# Altium footprint library SG__PCB_HOLE_Connector.PcbLib: 174 footprints (part 11 of 11)
Each footprint in its own frame and in the unit in brackets; x right, y up, seen from the top. Pads: shape width x height; smd on the part's side, far side on the other; paste and mask are expansions set on the pad; w line width, h text height; cw(c..) or ccw(c..) is an arc to the next point about the centre after c.
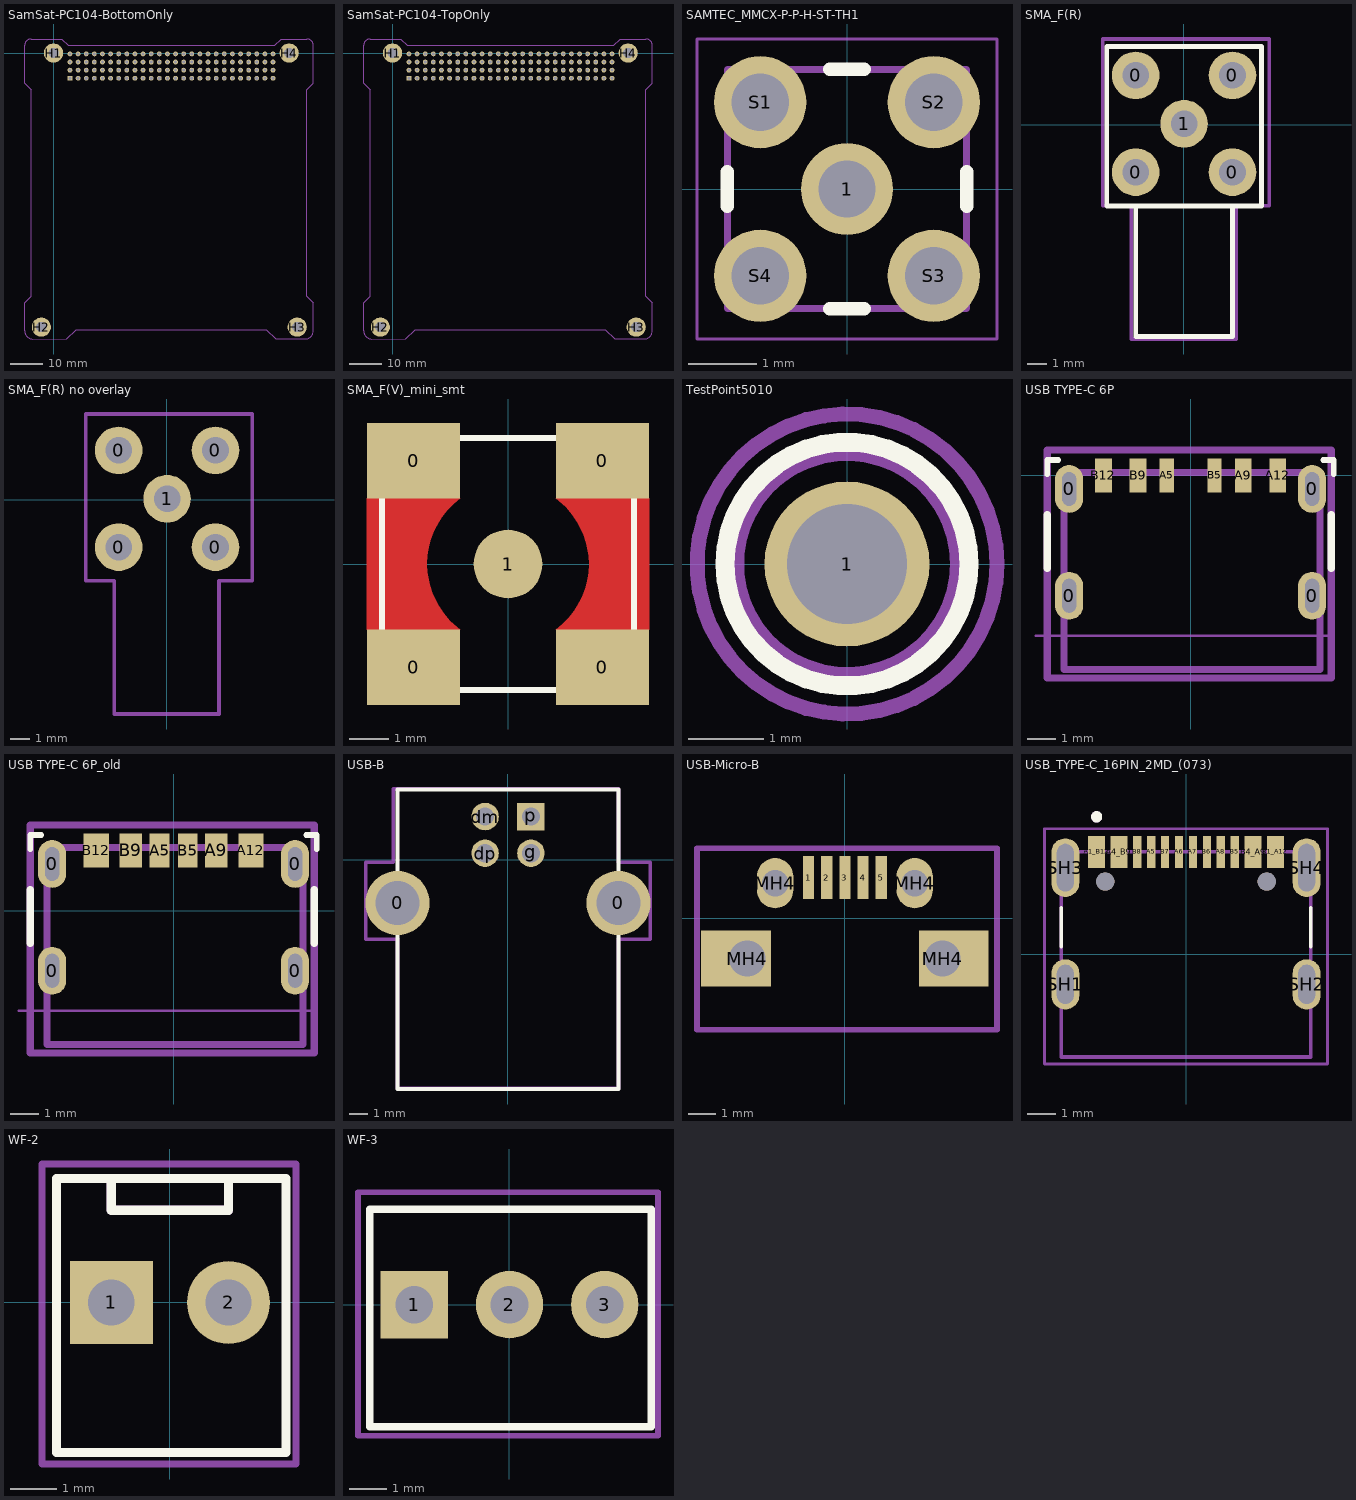
[diagram p10: the footprints below, top view; thin cyan lines are the x and y axes]

## SamSat-PC104-BottomOnly [mm]
pads (108):
  rect 1.5x1.5 hole 1: 1(5.15,-7.88)
  round 1.5 hole 1: 2(5.15,-5.34) 3(7.69,-7.88) 4(7.69,-5.34) 5(10.23,-7.88) 6(10.23,-5.34) 7(12.77,-7.88) 8(12.77,-5.34) 9(15.31,-7.88) 10(15.31,-5.34) 11(17.85,-7.88) 12(17.85,-5.34) 13(20.39,-7.88) 14(20.39,-5.34) 15(22.93,-7.88) 16(22.93,-5.34) 17(25.47,-7.88) 18(25.47,-5.34) 19(28.01,-7.88) 20(28.01,-5.34) 21(30.55,-7.88) 22(30.55,-5.34) 23(33.09,-7.88) 24(33.09,-5.34) 25(35.63,-7.88) 26(35.63,-5.34) 27(38.17,-7.88) 28(38.17,-5.34) 29(40.71,-7.88) 30(40.71,-5.34) 31(43.25,-7.88) 32(43.25,-5.34) 33(45.79,-7.88) 34(45.79,-5.34) 35(48.33,-7.88) 36(48.33,-5.34) 37(50.87,-7.88) 38(50.87,-5.34) 39(53.41,-7.88) 40(53.41,-5.34) 41(55.95,-7.88) 42(55.95,-5.34) 43(58.49,-7.88) 44(58.49,-5.34) 45(61.03,-7.88) 46(61.03,-5.34) 47(63.57,-7.88) 48(63.57,-5.34) 49(66.11,-7.88) 50(66.11,-5.34) 51(68.65,-7.88) 52(68.65,-5.34) 53(5.15,-2.8) 54(5.15,-0.26) 55(7.69,-2.8) 56(7.69,-0.26) 57(10.23,-2.8) 58(10.23,-0.26) 59(12.77,-2.8) 60(12.77,-0.26) 61(15.31,-2.8) 62(15.31,-0.26) 63(17.85,-2.8) 64(17.85,-0.26) 65(20.39,-2.8) 66(20.39,-0.26) 67(22.93,-2.8) 68(22.93,-0.26) 69(25.47,-2.8) 70(25.47,-0.26) 71(28.01,-2.8) 72(28.01,-0.26) 73(30.55,-2.8) 74(30.55,-0.26) 75(33.09,-2.8) 76(33.09,-0.26) 77(35.63,-2.8) 78(35.63,-0.26) 79(38.17,-2.8) 80(38.17,-0.26) 81(40.71,-2.8) 82(40.71,-0.26) 83(43.25,-2.8) 84(43.25,-0.26) 85(45.79,-2.8) 86(45.79,-0.26) 87(48.33,-2.8) 88(48.33,-0.26) 89(50.87,-2.8) 90(50.87,-0.26) 91(53.41,-2.8) 92(53.41,-0.26) 93(55.95,-2.8) 94(55.95,-0.26) 95(58.49,-2.8) 96(58.49,-0.26) 97(61.03,-2.8) 98(61.03,-0.26) 99(63.57,-2.8) 100(63.57,-0.26) 101(66.11,-2.8) 102(66.11,-0.26) 103(68.65,-2.8) 104(68.65,-0.26)
  round 6 hole 3.2: H1(0,0) H2(-3.8,-85.7) H3(76.2,-85.7) H4(73.7,0)
Board Shape:
  lines w0.254: -7.013,-76.129 -7.013,-11.529 -9.03,-9.512 -9.03,2.4 cw(c-7.03,2.4) -7.03,4.4 2.533,4.4 4.55,2.383 69.15,2.383 71.167,4.4 79.27,4.4 cw(c79.27,2.4) 81.27,2.4 81.27,-9.512 79.253,-11.529 79.253,-76.129 ; -7.013,-76.123 -9.03,-78.14 -9.03,-86.892 ccw(c-6.5,-86.892) -6.5,-89.422 4.175,-89.417 7.125,-86.467 66.55,-86.467 69.5,-89.417 78.729,-89.417 ccw(c78.718,-86.865) 81.27,-86.855 81.27,-78.14 79.253,-76.123
3D body "header2.stp": height 8.45, standoff 0, extent 21.705,-9.06 24.155,-4.16
3D body "header2.stp": height 8.45, standoff 0, extent 19.165,-9.06 21.615,-4.16
3D body "header2.stp": height 8.45, standoff 0, extent 16.625,-9.06 19.075,-4.16
3D body "header2.stp": height 8.45, standoff 0, extent 14.085,-9.06 16.535,-4.16
3D body "header2.stp": height 8.45, standoff 0, extent 3.925,-9.06 6.375,-4.16
3D body "header2.stp": height 8.45, standoff 0, extent 6.465,-9.06 8.915,-4.16
3D body "header2.stp": height 8.45, standoff 0, extent 9.005,-9.06 11.455,-4.16
3D body "header2.stp": height 8.45, standoff 0, extent 11.545,-9.06 13.995,-4.16
3D body "header2.stp": height 8.45, standoff 0, extent 24.245,-9.06 26.695,-4.16
3D body "header2.stp": height 8.45, standoff 0, extent 26.785,-9.06 29.235,-4.16
3D body "header2.stp": height 8.45, standoff 0, extent 29.325,-9.06 31.775,-4.16
3D body "header2.stp": height 8.45, standoff 0, extent 31.865,-9.06 34.315,-4.16
3D body "header2.stp": height 8.45, standoff 0, extent 52.185,-9.06 54.635,-4.16
3D body "header2.stp": height 8.45, standoff 0, extent 49.645,-9.06 52.095,-4.16
3D body "header2.stp": height 8.45, standoff 0, extent 47.105,-9.06 49.555,-4.16
3D body "header2.stp": height 8.45, standoff 0, extent 44.565,-9.06 47.015,-4.16
3D body "header2.stp": height 8.45, standoff 0, extent 34.405,-9.06 36.855,-4.16
3D body "header2.stp": height 8.45, standoff 0, extent 36.945,-9.06 39.395,-4.16
3D body "header2.stp": height 8.45, standoff 0, extent 39.485,-9.06 41.935,-4.16
3D body "header2.stp": height 8.45, standoff 0, extent 42.025,-9.06 44.475,-4.16
3D body "header2.stp": height 8.45, standoff 0, extent 54.725,-9.06 57.175,-4.16
3D body "header2.stp": height 8.45, standoff 0, extent 57.265,-9.06 59.715,-4.16
3D body "header2.stp": height 8.45, standoff 0, extent 59.805,-9.06 62.255,-4.16
3D body "header2.stp": height 8.45, standoff 0, extent 62.345,-9.06 64.795,-4.16
3D body "header2.stp": height 8.45, standoff 0, extent 64.885,-9.06 67.335,-4.16
3D body "header2.stp": height 8.45, standoff 0, extent 67.425,-9.06 69.875,-4.16
3D body "header2.stp": height 8.45, standoff 0, extent 21.705,-3.98 24.155,0.92
3D body "header2.stp": height 8.45, standoff 0, extent 19.165,-3.98 21.615,0.92
3D body "header2.stp": height 8.45, standoff 0, extent 16.625,-3.98 19.075,0.92
3D body "header2.stp": height 8.45, standoff 0, extent 14.085,-3.98 16.535,0.92
3D body "header2.stp": height 8.45, standoff 0, extent 3.925,-3.98 6.375,0.92
3D body "header2.stp": height 8.45, standoff 0, extent 6.465,-3.98 8.915,0.92
3D body "header2.stp": height 8.45, standoff 0, extent 9.005,-3.98 11.455,0.92
3D body "header2.stp": height 8.45, standoff 0, extent 11.545,-3.98 13.995,0.92
3D body "header2.stp": height 8.45, standoff 0, extent 24.245,-3.98 26.695,0.92
3D body "header2.stp": height 8.45, standoff 0, extent 26.785,-3.98 29.235,0.92
3D body "header2.stp": height 8.45, standoff 0, extent 29.325,-3.98 31.775,0.92
3D body "header2.stp": height 8.45, standoff 0, extent 31.865,-3.98 34.315,0.92
3D body "header2.stp": height 8.45, standoff 0, extent 52.185,-3.98 54.635,0.92
3D body "header2.stp": height 8.45, standoff 0, extent 49.645,-3.98 52.095,0.92
3D body "header2.stp": height 8.45, standoff 0, extent 47.105,-3.98 49.555,0.92
3D body "header2.stp": height 8.45, standoff 0, extent 44.565,-3.98 47.015,0.92
3D body "header2.stp": height 8.45, standoff 0, extent 34.405,-3.98 36.855,0.92
3D body "header2.stp": height 8.45, standoff 0, extent 36.945,-3.98 39.395,0.92
3D body "header2.stp": height 8.45, standoff 0, extent 39.485,-3.98 41.935,0.92
3D body "header2.stp": height 8.45, standoff 0, extent 42.025,-3.98 44.475,0.92
3D body "header2.stp": height 8.45, standoff 0, extent 54.725,-3.98 57.175,0.92
3D body "header2.stp": height 8.45, standoff 0, extent 57.265,-3.98 59.715,0.92
3D body "header2.stp": height 8.45, standoff 0, extent 59.805,-3.98 62.255,0.92
3D body "header2.stp": height 8.45, standoff 0, extent 62.345,-3.98 64.795,0.92
3D body "header2.stp": height 8.45, standoff 0, extent 64.885,-3.98 67.335,0.92
3D body "header2.stp": height 8.45, standoff 0, extent 67.425,-3.98 69.875,0.92

## SamSat-PC104-TopOnly [mm]
pads (108):
  rect 1.5x1.5 hole 1: 1(5.15,-7.88)
  round 1.5 hole 1: 2(5.15,-5.34) 3(7.69,-7.88) 4(7.69,-5.34) 5(10.23,-7.88) 6(10.23,-5.34) 7(12.77,-7.88) 8(12.77,-5.34) 9(15.31,-7.88) 10(15.31,-5.34) 11(17.85,-7.88) 12(17.85,-5.34) 13(20.39,-7.88) 14(20.39,-5.34) 15(22.93,-7.88) 16(22.93,-5.34) 17(25.47,-7.88) 18(25.47,-5.34) 19(28.01,-7.88) 20(28.01,-5.34) 21(30.55,-7.88) 22(30.55,-5.34) 23(33.09,-7.88) 24(33.09,-5.34) 25(35.63,-7.88) 26(35.63,-5.34) 27(38.17,-7.88) 28(38.17,-5.34) 29(40.71,-7.88) 30(40.71,-5.34) 31(43.25,-7.88) 32(43.25,-5.34) 33(45.79,-7.88) 34(45.79,-5.34) 35(48.33,-7.88) 36(48.33,-5.34) 37(50.87,-7.88) 38(50.87,-5.34) 39(53.41,-7.88) 40(53.41,-5.34) 41(55.95,-7.88) 42(55.95,-5.34) 43(58.49,-7.88) 44(58.49,-5.34) 45(61.03,-7.88) 46(61.03,-5.34) 47(63.57,-7.88) 48(63.57,-5.34) 49(66.11,-7.88) 50(66.11,-5.34) 51(68.65,-7.88) 52(68.65,-5.34) 53(5.15,-2.8) 54(5.15,-0.26) 55(7.69,-2.8) 56(7.69,-0.26) 57(10.23,-2.8) 58(10.23,-0.26) 59(12.77,-2.8) 60(12.77,-0.26) 61(15.31,-2.8) 62(15.31,-0.26) 63(17.85,-2.8) 64(17.85,-0.26) 65(20.39,-2.8) 66(20.39,-0.26) 67(22.93,-2.8) 68(22.93,-0.26) 69(25.47,-2.8) 70(25.47,-0.26) 71(28.01,-2.8) 72(28.01,-0.26) 73(30.55,-2.8) 74(30.55,-0.26) 75(33.09,-2.8) 76(33.09,-0.26) 77(35.63,-2.8) 78(35.63,-0.26) 79(38.17,-2.8) 80(38.17,-0.26) 81(40.71,-2.8) 82(40.71,-0.26) 83(43.25,-2.8) 84(43.25,-0.26) 85(45.79,-2.8) 86(45.79,-0.26) 87(48.33,-2.8) 88(48.33,-0.26) 89(50.87,-2.8) 90(50.87,-0.26) 91(53.41,-2.8) 92(53.41,-0.26) 93(55.95,-2.8) 94(55.95,-0.26) 95(58.49,-2.8) 96(58.49,-0.26) 97(61.03,-2.8) 98(61.03,-0.26) 99(63.57,-2.8) 100(63.57,-0.26) 101(66.11,-2.8) 102(66.11,-0.26) 103(68.65,-2.8) 104(68.65,-0.26)
  round 6 hole 3.2: H1(0,0) H2(-3.8,-85.7) H3(76.2,-85.7) H4(73.7,0)
Board Shape:
  lines w0.254: -7.013,-76.129 -7.013,-11.529 -9.03,-9.512 -9.03,2.4 cw(c-7.03,2.4) -7.03,4.4 2.533,4.4 4.55,2.383 69.15,2.383 71.167,4.4 79.27,4.4 cw(c79.27,2.4) 81.27,2.4 81.27,-9.512 79.253,-11.529 79.253,-76.129 ; -7.013,-76.123 -9.03,-78.14 -9.03,-86.892 ccw(c-6.5,-86.892) -6.5,-89.422 4.175,-89.417 7.125,-86.467 66.55,-86.467 69.5,-89.417 78.729,-89.417 ccw(c78.718,-86.865) 81.27,-86.855 81.27,-78.14 79.253,-76.123
3D body "PBS1-2.54.stp": height 9, standoff -2.65, extent 67.38,-1.53 69.92,1.01
3D body "PBS1-2.54.stp": height 9, standoff -2.65, extent 67.38,-4.07 69.92,-1.53
3D body "PBS1-2.54.stp": height 9, standoff -2.65, extent 54.68,-1.53 57.22,1.01
3D body "PBS1-2.54.stp": height 9, standoff -2.65, extent 54.68,-4.07 57.22,-1.53
3D body "PBS1-2.54.stp": height 9, standoff -2.65, extent 59.76,-1.53 62.3,1.01
3D body "PBS1-2.54.stp": height 9, standoff -2.65, extent 59.76,-4.07 62.3,-1.53
3D body "PBS1-2.54.stp": height 9, standoff -2.65, extent 57.22,-4.07 59.76,-1.53
3D body "PBS1-2.54.stp": height 9, standoff -2.65, extent 57.22,-1.53 59.76,1.01
3D body "PBS1-2.54.stp": height 9, standoff -2.65, extent 64.84,-1.53 67.38,1.01
3D body "PBS1-2.54.stp": height 9, standoff -2.65, extent 64.84,-4.07 67.38,-1.53
3D body "PBS1-2.54.stp": height 9, standoff -2.65, extent 62.3,-4.07 64.84,-1.53
3D body "PBS1-2.54.stp": height 9, standoff -2.65, extent 62.3,-1.53 64.84,1.01
3D body "PBS1-2.54.stp": height 9, standoff -2.65, extent 14.04,-4.07 16.58,-1.53
3D body "PBS1-2.54.stp": height 9, standoff -2.65, extent 16.58,-4.07 19.12,-1.53
3D body "PBS1-2.54.stp": height 9, standoff -2.65, extent 16.58,-1.53 19.12,1.01
3D body "PBS1-2.54.stp": height 9, standoff -2.65, extent 8.96,-1.53 11.5,1.01
3D body "PBS1-2.54.stp": height 9, standoff -2.65, extent 8.96,-4.07 11.5,-1.53
3D body "PBS1-2.54.stp": height 9, standoff -2.65, extent 11.5,-4.07 14.04,-1.53
3D body "PBS1-2.54.stp": height 9, standoff -2.65, extent 11.5,-1.53 14.04,1.01
3D body "PBS1-2.54.stp": height 9, standoff -2.65, extent 6.42,-1.53 8.96,1.01
3D body "PBS1-2.54.stp": height 9, standoff -2.65, extent 6.42,-4.07 8.96,-1.53
3D body "PBS1-2.54.stp": height 9, standoff -2.65, extent 3.88,-4.07 6.42,-1.53
3D body "PBS1-2.54.stp": height 9, standoff -2.65, extent 3.88,-1.53 6.42,1.01
3D body "PBS1-2.54.stp": height 9, standoff -2.65, extent 29.28,-1.53 31.82,1.01
3D body "PBS1-2.54.stp": height 9, standoff -2.65, extent 29.28,-4.07 31.82,-1.53
3D body "PBS1-2.54.stp": height 9, standoff -2.65, extent 31.82,-4.07 34.36,-1.53
3D body "PBS1-2.54.stp": height 9, standoff -2.65, extent 31.82,-1.53 34.36,1.01
3D body "PBS1-2.54.stp": height 9, standoff -2.65, extent 36.9,-1.53 39.44,1.01
3D body "PBS1-2.54.stp": height 9, standoff -2.65, extent 36.9,-4.07 39.44,-1.53
3D body "PBS1-2.54.stp": height 9, standoff -2.65, extent 34.36,-4.07 36.9,-1.53
3D body "PBS1-2.54.stp": height 9, standoff -2.65, extent 34.36,-1.53 36.9,1.01
3D body "PBS1-2.54.stp": height 9, standoff -2.65, extent 41.98,-1.53 44.52,1.01
3D body "PBS1-2.54.stp": height 9, standoff -2.65, extent 41.98,-4.07 44.52,-1.53
3D body "PBS1-2.54.stp": height 9, standoff -2.65, extent 39.44,-4.07 41.98,-1.53
3D body "PBS1-2.54.stp": height 9, standoff -2.65, extent 39.44,-1.53 41.98,1.01
3D body "PBS1-2.54.stp": height 9, standoff -2.65, extent 47.06,-1.53 49.6,1.01
3D body "PBS1-2.54.stp": height 9, standoff -2.65, extent 47.06,-4.07 49.6,-1.53
3D body "PBS1-2.54.stp": height 9, standoff -2.65, extent 44.52,-4.07 47.06,-1.53
3D body "PBS1-2.54.stp": height 9, standoff -2.65, extent 44.52,-1.53 47.06,1.01
3D body "PBS1-2.54.stp": height 9, standoff -2.65, extent 52.14,-1.53 54.68,1.01
3D body "PBS1-2.54.stp": height 9, standoff -2.65, extent 52.14,-4.07 54.68,-1.53
3D body "PBS1-2.54.stp": height 9, standoff -2.65, extent 49.6,-4.07 52.14,-1.53
3D body "PBS1-2.54.stp": height 9, standoff -2.65, extent 49.6,-1.53 52.14,1.01
3D body "PBS1-2.54.stp": height 9, standoff -2.65, extent 24.2,-1.53 26.74,1.01
3D body "PBS1-2.54.stp": height 9, standoff -2.65, extent 24.2,-4.07 26.74,-1.53
3D body "PBS1-2.54.stp": height 9, standoff -2.65, extent 26.74,-4.07 29.28,-1.53
3D body "PBS1-2.54.stp": height 9, standoff -2.65, extent 26.74,-1.53 29.28,1.01
3D body "PBS1-2.54.stp": height 9, standoff -2.65, extent 19.12,-1.53 21.66,1.01
3D body "PBS1-2.54.stp": height 9, standoff -2.65, extent 19.12,-4.07 21.66,-1.53
3D body "PBS1-2.54.stp": height 9, standoff -2.65, extent 21.66,-4.07 24.2,-1.53
3D body "PBS1-2.54.stp": height 9, standoff -2.65, extent 21.66,-1.53 24.2,1.01
3D body "PBS1-2.54.stp": height 9, standoff -2.65, extent 14.04,-1.53 16.58,1.01
3D body "PBS1-2.54.stp": height 9, standoff -2.65, extent 67.38,-6.61 69.92,-4.07
3D body "PBS1-2.54.stp": height 9, standoff -2.65, extent 67.38,-9.15 69.92,-6.61
3D body "PBS1-2.54.stp": height 9, standoff -2.65, extent 54.68,-6.61 57.22,-4.07
3D body "PBS1-2.54.stp": height 9, standoff -2.65, extent 54.68,-9.15 57.22,-6.61
3D body "PBS1-2.54.stp": height 9, standoff -2.65, extent 59.76,-6.61 62.3,-4.07
3D body "PBS1-2.54.stp": height 9, standoff -2.65, extent 59.76,-9.15 62.3,-6.61
3D body "PBS1-2.54.stp": height 9, standoff -2.65, extent 57.22,-9.15 59.76,-6.61
3D body "PBS1-2.54.stp": height 9, standoff -2.65, extent 57.22,-6.61 59.76,-4.07
3D body "PBS1-2.54.stp": height 9, standoff -2.65, extent 64.84,-6.61 67.38,-4.07
3D body "PBS1-2.54.stp": height 9, standoff -2.65, extent 64.84,-9.15 67.38,-6.61
3D body "PBS1-2.54.stp": height 9, standoff -2.65, extent 62.3,-9.15 64.84,-6.61
3D body "PBS1-2.54.stp": height 9, standoff -2.65, extent 62.3,-6.61 64.84,-4.07
3D body "PBS1-2.54.stp": height 9, standoff -2.65, extent 14.04,-9.15 16.58,-6.61
3D body "PBS1-2.54.stp": height 9, standoff -2.65, extent 16.58,-9.15 19.12,-6.61
3D body "PBS1-2.54.stp": height 9, standoff -2.65, extent 16.58,-6.61 19.12,-4.07
3D body "PBS1-2.54.stp": height 9, standoff -2.65, extent 8.96,-6.61 11.5,-4.07
3D body "PBS1-2.54.stp": height 9, standoff -2.65, extent 8.96,-9.15 11.5,-6.61
3D body "PBS1-2.54.stp": height 9, standoff -2.65, extent 11.5,-9.15 14.04,-6.61
3D body "PBS1-2.54.stp": height 9, standoff -2.65, extent 11.5,-6.61 14.04,-4.07
3D body "PBS1-2.54.stp": height 9, standoff -2.65, extent 6.42,-6.61 8.96,-4.07
3D body "PBS1-2.54.stp": height 9, standoff -2.65, extent 6.42,-9.15 8.96,-6.61
3D body "PBS1-2.54.stp": height 9, standoff -2.65, extent 3.88,-9.15 6.42,-6.61
3D body "PBS1-2.54.stp": height 9, standoff -2.65, extent 3.88,-6.61 6.42,-4.07
3D body "PBS1-2.54.stp": height 9, standoff -2.65, extent 29.28,-6.61 31.82,-4.07
3D body "PBS1-2.54.stp": height 9, standoff -2.65, extent 29.28,-9.15 31.82,-6.61
3D body "PBS1-2.54.stp": height 9, standoff -2.65, extent 31.82,-9.15 34.36,-6.61
3D body "PBS1-2.54.stp": height 9, standoff -2.65, extent 31.82,-6.61 34.36,-4.07
3D body "PBS1-2.54.stp": height 9, standoff -2.65, extent 36.9,-6.61 39.44,-4.07
3D body "PBS1-2.54.stp": height 9, standoff -2.65, extent 36.9,-9.15 39.44,-6.61
3D body "PBS1-2.54.stp": height 9, standoff -2.65, extent 34.36,-9.15 36.9,-6.61
3D body "PBS1-2.54.stp": height 9, standoff -2.65, extent 34.36,-6.61 36.9,-4.07
3D body "PBS1-2.54.stp": height 9, standoff -2.65, extent 41.98,-6.61 44.52,-4.07
3D body "PBS1-2.54.stp": height 9, standoff -2.65, extent 41.98,-9.15 44.52,-6.61
3D body "PBS1-2.54.stp": height 9, standoff -2.65, extent 39.44,-9.15 41.98,-6.61
3D body "PBS1-2.54.stp": height 9, standoff -2.65, extent 39.44,-6.61 41.98,-4.07
3D body "PBS1-2.54.stp": height 9, standoff -2.65, extent 47.06,-6.61 49.6,-4.07
3D body "PBS1-2.54.stp": height 9, standoff -2.65, extent 47.06,-9.15 49.6,-6.61
3D body "PBS1-2.54.stp": height 9, standoff -2.65, extent 44.52,-9.15 47.06,-6.61
3D body "PBS1-2.54.stp": height 9, standoff -2.65, extent 44.52,-6.61 47.06,-4.07
3D body "PBS1-2.54.stp": height 9, standoff -2.65, extent 52.14,-6.61 54.68,-4.07
3D body "PBS1-2.54.stp": height 9, standoff -2.65, extent 52.14,-9.15 54.68,-6.61
3D body "PBS1-2.54.stp": height 9, standoff -2.65, extent 49.6,-9.15 52.14,-6.61
3D body "PBS1-2.54.stp": height 9, standoff -2.65, extent 49.6,-6.61 52.14,-4.07
3D body "PBS1-2.54.stp": height 9, standoff -2.65, extent 24.2,-6.61 26.74,-4.07
3D body "PBS1-2.54.stp": height 9, standoff -2.65, extent 24.2,-9.15 26.74,-6.61
3D body "PBS1-2.54.stp": height 9, standoff -2.65, extent 26.74,-9.15 29.28,-6.61
3D body "PBS1-2.54.stp": height 9, standoff -2.65, extent 26.74,-6.61 29.28,-4.07
3D body "PBS1-2.54.stp": height 9, standoff -2.65, extent 19.12,-6.61 21.66,-4.07
3D body "PBS1-2.54.stp": height 9, standoff -2.65, extent 19.12,-9.15 21.66,-6.61
3D body "PBS1-2.54.stp": height 9, standoff -2.65, extent 21.66,-9.15 24.2,-6.61
3D body "PBS1-2.54.stp": height 9, standoff -2.65, extent 21.66,-6.61 24.2,-4.07
3D body "PBS1-2.54.stp": height 9, standoff -2.65, extent 14.04,-6.61 16.58,-4.07

## SAMTEC_MMCX-P-P-H-ST-TH1 [mm]
pads (5):
  round 1.348 hole 0.84: 1(0,0) S1(-1.27,1.27) S2(1.27,1.27) S3(1.27,-1.27) S4(-1.27,-1.27)
Top Overlay:
  lines w0.2: -1.75,-0.25 -1.75,0.25 ; -0.25,-1.75 0.25,-1.75 ; -0.25,1.75 0.25,1.75 ; 1.75,-0.25 1.75,0.25
Top Assembly:
  lines w0.1: -1.75,-1.75 1.75,-1.75 1.75,1.75 -1.75,1.75 -1.75,-1.75
Top Courtyard:
  lines w0.05: -2.195,-2.195 -2.195,2.195 2.195,2.195 2.195,-2.195 -2.195,-2.195
3D body "MMCX-P-P-H-ST-TH1.stp": height 5.35, standoff -2.05, extent -1.75,-1.75 1.75,1.75

## SMA_F(R) [mm]
pads (5):
  round 2.5 hole 1.4: 0(-2.515,-2.49) 0(-2.515,2.59) 0(2.565,-2.49) 0(2.565,2.59) 1(0.025,0.05)
Top Overlay:
  lines w0.254: -2.515,-4.268 -2.515,-11.126 2.565,-11.126 2.565,-4.268 ; -4.039,-4.268 -4.039,4.114 4.089,4.114 4.089,-3.76 4.089,-4.268 -4.039,-4.268
Top Courtyard:
  lines w0.2: -4.25,-4.25 -4.25,4.5 4.5,4.5 4.5,-4.25 2.75,-4.25 2.75,-11.25 -2.75,-11.25 -2.75,-4.25 -4.25,-4.25
3D body "SMA-F (R).step": height 11.86, standoff -2.24, extent -3.419,-11.31 3.581,3.79

## SMA_F(R) no overlay [mm]
pads (5):
  round 2.5 hole 1.4: 0(-2.515,-2.49) 0(-2.515,2.59) 0(2.565,-2.49) 0(2.565,2.59) 1(0.025,0.05)
Top Courtyard:
  lines w0.2: -4.25,-4.25 -4.25,4.5 4.5,4.5 4.5,-4.25 2.75,-4.25 2.75,-11.25 -2.75,-11.25 -2.75,-4.25 -4.25,-4.25
3D body "SMA-F (R).step": height 11.86, standoff -2.24, extent -3.419,-11.31 3.581,3.79

## SMA_F(V)_mini_smt [mm] "rf con"
pads (5):
  rect 2.35x1.908 smd: 0(-2.38,-2.606) 0(-2.38,2.606) 0(2.38,-2.606) 0(2.38,2.606)
  round 1.73 smd: 1(0,0)
Top Layer:
  region: -3.555,1.652 -1.205,1.652 -1.381,1.509 -1.529,1.358 -1.668,1.184 -1.75,1.058 -1.859,0.852 -1.948,0.624 -2,0.426 -2.033,0.224 -2.045,0 -2.034,-0.212 -1.978,-0.521 -1.896,-0.767 -1.75,-1.058 -1.622,-1.246 -1.464,-1.428 -1.205,-1.652 -3.555,-1.652
  region: 3.555,-1.652 1.205,-1.652 1.381,-1.509 1.529,-1.358 1.668,-1.184 1.75,-1.058 1.859,-0.852 1.948,-0.624 2,-0.426 2.033,-0.224 2.045,0 2.034,0.212 1.978,0.521 1.896,0.767 1.75,1.058 1.622,1.246 1.464,1.428 1.205,1.652 3.555,1.652
Top Overlay:
  lines w0.152: -3.175,-3.175 -3.175,-3.175 ; -3.175,-3.175 -3.175,3.172 3.175,3.172 3.175,-3.175 -3.175,-3.175
3D body: height 2.29, standoff 0, extent -3.175,-3.175 3.175,3.175
3D body: height 8.84, standoff 0, extent -3.175,-3.172 3.175,3.172

## TestPoint5010 [mm]
pads (1):
  round 2.2 hole 1.6: 1(0,0)
Top Overlay:
  circle w0.254: c0,0 r1.626
Top Assembly:
  circle w0.254: c0,0 r1.5
Top Courtyard:
  circle w0.2: c0,0 r2
3D body "TEST POINT RED Keystone 5010.step": height 8.13, standoff -3.1, extent -1.587,-1.587 1.588,1.587

## USB TYPE-C 6P [mm] "USB Type-C Connector with 6 pins"
height 2.667
pads (10):
  oval 1x1.7 hole 0.5 slot 1.2 at 90 deg: 0(-4.32,-4.28) 0(-4.32,-0.48) 0(4.32,-4.28) 0(4.32,-0.48)
  rect 0.5x1.2 smd: A5(-0.85,0) B5(0.85,0)
  rect 0.6x1.2 smd: A9(1.87,0) A12(3.1,0) B9(-1.87,0) B12(-3.1,0)
Top Overlay:
  lines w0.2: -5.095,0.041 -5.095,0.549 -4.714,0.549 ; 4.714,0.549 5.095,0.549 5.095,0.041
  lines w0.254: -5.1,-3.3 -5.1,-1.4 ; 5,-3.3 5,-1.4
Top Assembly:
  lines w0.254: -4.5,-6.9 4.6,-6.9 4.6,0.1 -4.5,0.1 -4.5,-6.9
Dimensions:
  lines w0.1: -5.5,-5.7 5,-5.7
  text "Board edge" at 3.9,-6 h0.2
Top Courtyard:
  lines w0.254: -5.1,-7.2 5,-7.2 5,0.9 -5.1,0.9 -5.1,-7.2
3D body "USB Connector Type C female 6pin.STEP": height 3.2, standoff -1.02, extent -4.47,-6.9 4.47,-0.03

## USB TYPE-C 6P_old [mm] "USB Type-C Connector with 6 pins"
height 2.667
pads (10):
  oval 1x1.7 hole 0.5 slot 1.2 at 90 deg: 0(-4.32,-2.14) 0(-4.32,1.66) 0(4.32,-2.14) 0(4.32,1.66)
  rect 0.7x1.2 smd: A5(-0.5,2.14) B5(0.5,2.14)
  rect 0.8x1.2 smd: A9(1.52,2.14) B9(-1.52,2.14)
  rect 0.9x1.2 smd: A12(2.75,2.14) B12(-2.75,2.14)
Top Overlay:
  lines w0.2: -5.095,2.181 -5.095,2.689 -4.714,2.689 ; 4.714,2.689 5.095,2.689 5.095,2.181
  lines w0.254: -5.1,-1.16 -5.1,0.74 ; 5,-1.16 5,0.74
Top Assembly:
  lines w0.254: -4.5,-4.76 4.6,-4.76 4.6,2.24 -4.5,2.24 -4.5,-4.76
Dimensions:
  lines w0.1: -5.5,-3.56 5,-3.56
  text "Board edge" at 3.9,-3.86 h0.2
Top Courtyard:
  lines w0.254: -5.1,-5.06 5,-5.06 5,3.04 -5.1,3.04 -5.1,-5.06
3D body "USB Connector Type C female 6pin.STEP": height 3.2, standoff -1.02, extent -4.47,-4.76 4.47,2.11

## USB-B [mm]
pads (6):
  round 3.5 hole 2.4 mask+0.05: 0(-6.02,-2.355) 0(6.02,-2.355)
  round 1.5 hole 1 mask+0.05: dm(-1.25,2.355) dp(-1.25,0.355) g(1.25,0.355)
  rect 1.5x1.5 hole 1 mask+0.05: p(1.25,2.355)
Top Overlay:
  lines w0.2: -6.02,-12.495 6.02,-12.495 6.02,3.83 -6.02,3.83 -6.02,-12.495
Top Courtyard:
  lines w0.2: -7.75,-4.332 -7.75,-0.395 -7.75,-0.145 -6.25,-0.145 -6.25,3.855 6.02,3.855 6.02,-0.145 7.75,-0.145 7.75,-4.332 6.02,-4.332 6.02,-12.453 -6.02,-12.453 -6.02,-4.332 -7.75,-4.332
3D body "USB B.STEP": height 12, standoff -2.64, extent -7.425,-12.645 7.373,3.855

## USB-Micro-B [mm]
pads (9):
  rect 0.4x1.55 smd: 1(-1.3,1.45) 2(-0.65,1.45) 3(0,1.45) 4(0.65,1.45) 5(1.3,1.45)
  rect 2.5x2 hole 1.3 copper offset -0.4,0: MH4(-3.5,-1.45)
  oval 1.3x1.8 hole 0.95: MH4(-2.5,1.25) MH4(2.5,1.25)
  rect 2.5x2 hole 1.3 copper offset 0.4,0: MH4(3.5,-1.45)
Top Courtyard:
  lines w0.2: -5.3,-4 -5.3,2.5 5.45,2.5 5.45,-4 -5.3,-4
3D body "Micro USB-B Female 5Pin SMD.STEP": height 2.7, standoff -1.02, extent -4,-4.075 4.05,1.725

## USB_TYPE-C_16PIN_2MD_(073) [mm]
height 3.16
pads (18):
  rect 0.6x1.15 smd paste+0 mask+0: A1_B12(-3.2,3.67) A4_B9(-2.4,3.67) B1_A12(3.2,3.67) B4_A9(2.4,3.67)
  rect 0.3x1.15 smd paste+0 mask+0: A5(-1.25,3.67) A6(-0.25,3.67) A7(0.25,3.67) A8(1.25,3.67) B5(1.75,3.67) B6(0.75,3.67) B7(-0.75,3.67) B8(-1.75,3.67)
  oval 1x1.8 hole 0.6 slot 1.4 at 90 deg mask+0.102: SH1(-4.32,-1.075) SH2(4.32,-1.075)
  oval 1x2.1 hole 0.6 slot 1.7 at 90 deg mask+0.102: SH3(-4.32,3.105) SH4(4.32,3.105)
  round 0.65 hole 0.65 unplated mask+0: ""(-2.89,2.605) ""(2.89,2.605)
Top Overlay:
  circle w0.2: c-3.2,4.925 r0.1
  lines w0.127: -4.47,0.275 -4.47,1.675 ; 4.47,0.275 4.47,1.675
Top Solder:
  region: 2.75,3.055 2.05,3.055 2.05,4.295 2.75,4.295
  region: -2.05,3.055 -2.75,3.055 -2.75,4.295 -2.05,4.295
  region: 3.55,3.055 2.85,3.055 2.85,4.295 3.55,4.295
  region: -2.85,3.055 -3.55,3.055 -3.55,4.295 -2.85,4.295
  region: 0.45,3.055 0.05,3.055 0.05,4.295 0.45,4.295
  region: -0.05,3.055 -0.45,3.055 -0.45,4.295 -0.05,4.295
  region: 0.95,3.055 0.55,3.055 0.55,4.295 0.95,4.295
  region: 1.45,3.055 1.05,3.055 1.05,4.295 1.45,4.295
  region: 1.95,3.055 1.55,3.055 1.55,4.295 1.95,4.295
  region: -0.55,3.055 -0.95,3.055 -0.95,4.295 -0.55,4.295
  region: -1.05,3.055 -1.45,3.055 -1.45,4.295 -1.05,4.295
  region: -1.55,3.055 -1.95,3.055 -1.95,4.295 -1.55,4.295
Top Assembly:
  lines w0.127: -4.47,-3.675 4.47,-3.675 4.47,3.675 -4.47,3.675 -4.47,-3.675
Top Courtyard:
  lines w0.1: -5.07,-3.925 5.07,-3.925 5.07,4.495 -5.07,4.495 -5.07,-3.925
Mechanical 13:
  circle w0.2: c-3.2,4.925 r0.1
3D body "step_temp.STEP": height 3.26, standoff -0.9, extent -4.47,-3.675 4.47,3.975

## WF-2 [mm]
height 12
pads (2):
  rect 1.8x1.8 hole 1: 1(-1.27,0)
  round 1.8 hole 1: 2(1.27,0)
Top Overlay:
  lines w0.2: -2.455,2.549 -2.455,-3.251 ; -1.27,2.686 -1.27,2 1.27,2 1.27,2.686 ; -2.455,-3.251 2.516,-3.251 2.516,2.686 -2.455,2.686 -2.455,-3.251
Top Assembly:
  lines w0.152: -2.455,2.549 -2.455,-3.251 ; -2.455,-3.251 -2.455,2.686 2.516,2.686 2.516,-3.251 -2.455,-3.251
  lines w0.2: -1.27,2.686 -1.27,2 1.27,2 1.27,2.686
Top Courtyard:
  lines w0.152: -2.77,-3.5 -2.77,3 2.73,3 2.73,-3.5 -2.77,-3.5
3D body "WF-2.STEP": height 2.28, standoff -12.12, extent -2.445,-3.178 2.555,2.622

## WF-3 [mm]
height 12
pads (3):
  rect 1.8x1.8 hole 1: 1(-2.54,0)
  round 1.8 hole 1: 2(0,0) 3(2.54,0)
Top Overlay:
  lines w0.2: -3.725,-3.251 -3.725,2.549 ; -3.725,-3.251 3.775,-3.251 ; -3.725,-3.251 -3.725,2.549 ; -3.725,-3.251 3.775,-3.251 ; -3.725,2.549 3.775,2.549 ; -3.725,2.549 3.775,2.549 ; 3.775,-3.251 3.775,2.549 ; 3.775,-3.251 3.775,2.549
Top Courtyard:
  lines w0.152: -4.04,-3.5 3.96,-3.5 3.96,3 -4.04,3 -4.04,-3.5
3D body "WF-3-1.STEP": height 11.62, standoff -2.78, extent -3.725,-3.251 3.775,2.549